# Altium footprint library PcbLib1.PcbLib: 1009 footprints (part 12 of 64)
Each footprint in its own frame and in the unit in brackets; x right, y up, seen from the top. Pads: shape width x height; smd on the part's side, far side on the other; paste and mask are expansions set on the pad; w line width, h text height; cw(c..) or ccw(c..) is an arc to the next point about the centre after c.
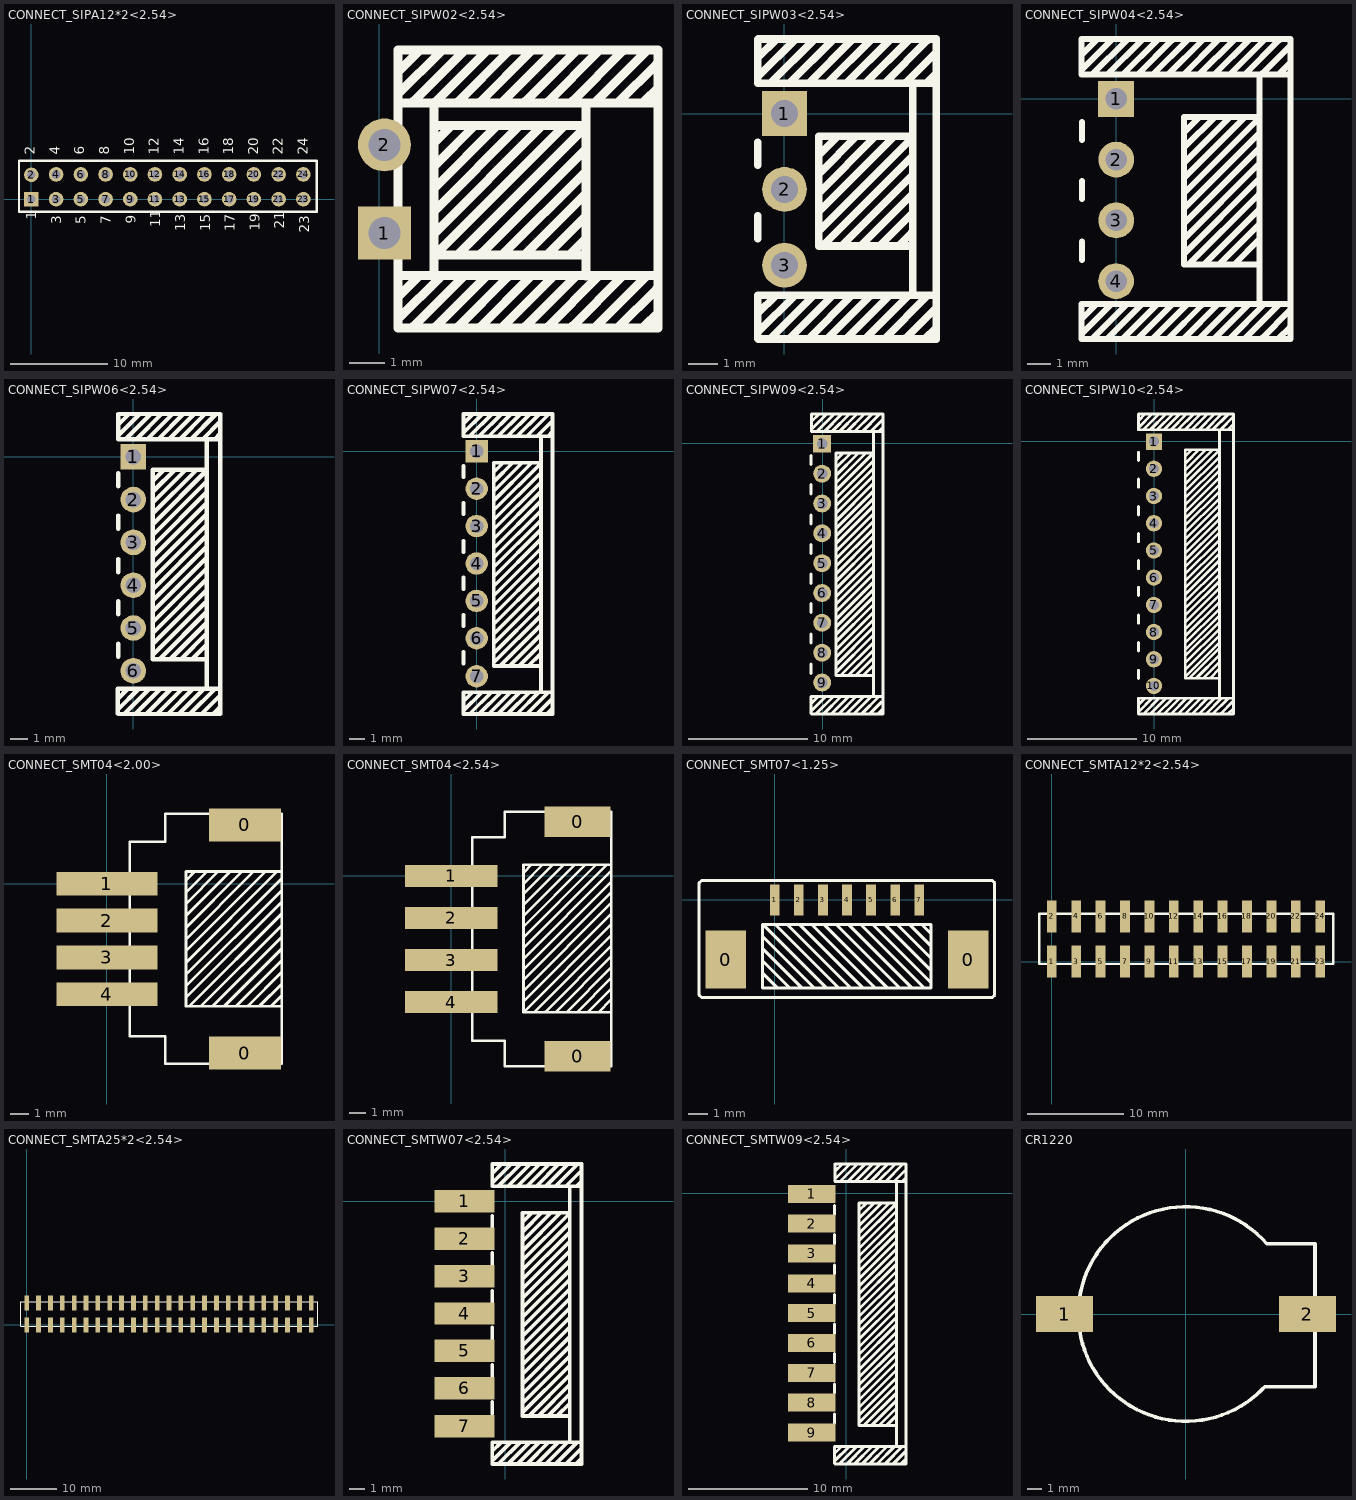
[diagram p11: the footprints below, top view; thin cyan lines are the x and y axes]

## CONNECT_SIPA12*2<2.54> [mm] "排针母座"
pads (24):
  rect 1.5x1.5 hole 0.9: 1(0,0)
  round 1.5 hole 0.9: 2(0,2.5) 3(2.54,0) 4(2.54,2.54) 5(5.08,0) 6(5.08,2.54) 7(7.62,0) 8(7.62,2.54) 9(10.16,0) 10(10.16,2.54) 11(12.7,0) 12(12.7,2.54) 13(15.24,0) 14(15.24,2.54) 15(17.78,0) 16(17.78,2.54) 17(20.32,0) 18(20.32,2.54) 19(22.86,0) 20(22.86,2.54) 21(25.4,0) 22(25.4,2.54) 23(27.94,0) 24(27.94,2.54)
Top Overlay:
  lines w0.254: -1.27,-1.295 29.337,-1.295 29.337,3.937 -1.27,3.937 -1.27,-1.295
  text "22" at 25.848,4.547 h1
  text "24" at 28.397,4.547 h1
  text "23" at 28.55,-3.454 h1
  text "21" at 26.001,-3.026 h1
  text "1" at 0.514,-2.136 h1
  text "19" at 23.452,-3.25 h1
  text "15" at 18.355,-3.297 h1
  text "11" at 13.257,-2.869 h1
  text "5" at 5.611,-2.564 h1
  text "3" at 3.062,-2.564 h1
  text "7" at 8.16,-2.564 h1
  text "9" at 10.709,-2.517 h1
  text "13" at 15.806,-3.297 h1
  text "17" at 20.903,-3.297 h1
  text "2" at 0.356,4.547 h1
  text "20" at 23.299,4.547 h1
  text "16" at 18.2,4.547 h1
  text "12" at 13.102,4.547 h1
  text "6" at 5.454,4.547 h1
  text "4" at 2.905,4.547 h1
  text "8" at 8.003,4.547 h1
  text "10" at 10.553,4.547 h1
  text "14" at 15.651,4.547 h1
  text "18" at 20.749,4.547 h1

## CONNECT_SIPW02<2.54> [mm] "四针白色插座（未加焊）"
height 7
pads (2):
  rect 1.5x1.5 hole 0.9: 1(0.152,-13.747)
  round 1.5 hole 0.9: 2(0.152,-11.247)
Top Overlay:
  lines w0.254: 0.533,-16.434 7.899,-16.434 7.899,-8.56 0.533,-8.56 ; 0.533,-16.408 0.533,-14.961 0.533,-10.033 0.533,-8.585 ; 0.533,-16.18 0.548,-16.18 1.76,-14.968 ; 0.533,-15.57 0.533,-15.559 1.125,-14.968 ; 0.533,-14.95 7.849,-14.95 ; 0.533,-10.058 7.899,-10.058 ; 0.533,-9.804 0.548,-9.804 1.76,-8.592 ; 0.533,-9.195 0.533,-9.184 1.125,-8.592 ; 0.965,-16.398 2.395,-14.968 ; 0.965,-10.022 2.395,-8.592 ; 1.549,-14.884 1.549,-14.315 1.549,-10.643 1.549,-10.124 ; 1.549,-12.497 3.353,-10.693 ; 1.549,-10.693 5.867,-10.693 ; 1.575,-11.836 2.718,-10.693 ; 1.575,-11.176 2.057,-10.693 ; 1.587,-13.094 3.988,-10.693 ; 1.589,-16.408 3.03,-14.968 ; 1.589,-10.033 3.03,-8.592 ; 1.593,-14.365 5.867,-14.365 ; 1.593,-14.358 5.258,-10.693 ; 1.6,-13.716 4.623,-10.693 ; 2.228,-16.408 3.667,-14.97 ; 2.228,-10.033 3.667,-8.594 ; 2.253,-14.333 5.867,-10.719 ; 2.859,-16.408 4.287,-14.981 ; 2.859,-10.033 4.287,-8.605 ; 2.908,-14.313 5.855,-11.367 ; 3.494,-16.408 4.935,-14.968 ; 3.494,-10.033 4.935,-8.592 ; 3.511,-14.345 5.855,-12.002 ; 4.133,-14.358 5.867,-12.624 ; 4.14,-16.398 5.583,-14.955 ; 4.14,-10.022 5.583,-8.58 ; 4.775,-16.408 6.21,-14.973 ; 4.775,-10.033 6.21,-8.598 ; 4.781,-14.345 5.842,-13.284 ; 5.39,-14.371 5.829,-13.932 ; 5.486,-16.383 6.909,-14.961 ; 5.486,-10.008 6.909,-8.585 ; 5.867,-14.961 5.867,-10.744 5.867,-10.109 ; 6.121,-16.415 7.56,-14.977 ; 6.121,-10.04 7.56,-8.601 ; 6.782,-16.415 7.865,-15.332 ; 6.782,-10.04 7.865,-8.957 ; 7.518,-16.39 7.903,-16.006 ; 7.518,-10.015 7.903,-9.63
3D body "v150-090.stp": height 0.02, standoff -1.65, extent -0.598,-11.997 0.902,-10.497
3D body "vf150-090.stp": height 0.01, standoff -1.65, extent -0.598,-14.497 0.902,-12.997
3D body "609-2p-vr130.stp": height 5.75, standoff -3.35, extent 0.02,-16.247 7.66,-8.747

## CONNECT_SIPW03<2.54> [mm] "四针白色插座（未加焊）"
height 7
pads (3):
  rect 1.5x1.5 hole 0.9: 1(0,0)
  round 1.5 hole 0.9: 2(0.003,-2.54) 3(0.003,-5.08)
Top Overlay:
  lines w0.254: -0.889,-7.315 -0.874,-7.315 0.337,-6.103 ; -0.889,-6.706 -0.889,-6.695 -0.298,-6.103 ; -0.889,-6.096 -0.889,-7.544 -0.882,-7.551 -0.063,-7.551 5.08,-7.551 5.08,2.5 -0.063,2.5 -0.878,2.5 -0.889,2.489 -0.889,1.016 5.029,1.016 ; -0.889,-6.085 5.08,-6.085 ; -0.889,-4.191 -0.889,-3.429 ; -0.889,-1.727 -0.889,-0.965 ; -0.889,1.245 -0.874,1.245 0.381,2.5 ; -0.889,1.854 -0.889,1.865 -0.254,2.5 ; -0.457,-7.544 -0.457,-7.533 0.972,-6.103 ; -0.457,1.016 -0.457,1.027 1.016,2.5 ; 0.102,-7.544 0.167,-7.544 1.607,-6.103 ; 0.102,1.016 0.167,1.016 1.651,2.5 ; 0.762,-7.544 0.806,-7.544 2.244,-6.105 ; 0.762,1.016 0.806,1.016 2.29,2.5 ; 1.143,-3.937 4.293,-0.787 ; 1.143,-2.667 3.048,-0.762 ; 1.143,-1.981 1.194,-1.981 2.413,-0.762 ; 1.143,-1.397 1.778,-0.762 ; 1.168,-3.277 3.683,-0.762 ; 1.333,-4.381 4.28,-1.435 ; 1.422,-7.544 1.437,-7.544 2.865,-6.116 ; 1.422,1.016 1.437,1.016 2.921,2.5 ; 1.936,-4.414 4.28,-2.07 ; 2.057,-7.544 2.072,-7.544 3.512,-6.103 ; 2.057,1.016 2.072,1.016 3.556,2.5 ; 2.558,-4.427 4.293,-2.692 ; 2.718,-7.544 2.718,-7.533 4.16,-6.091 ; 2.718,1.016 2.718,1.027 4.191,2.5 ; 3.206,-4.414 4.267,-3.353 ; 3.353,-7.544 4.788,-6.109 ; 3.353,1.016 4.788,2.451 ; 3.816,-4.439 4.255,-4 ; 4.064,-7.518 5.029,-6.553 ; 4.064,1.041 5.067,2.045 ; 4.293,-6.071 4.293,-0.787 ; 4.293,-4.434 1.143,-4.434 1.143,-0.762 4.293,-0.762 ; 4.293,0.889 4.293,-0.787 ; 4.699,-7.551 5.08,-7.17 ; 4.75,1.016 5.08,1.346

## CONNECT_SIPW04<2.54> [mm] "四针白色插座（未加焊）"
height 7
pads (4):
  rect 1.5x1.5 hole 0.9: 1(0,0)
  round 1.5 hole 0.9: 2(0.003,-2.54) 3(0.003,-5.08) 4(0,-7.62)
Top Overlay:
  lines w0.254: -1.422,-9.184 -0.831,-8.592 ; -1.422,-6.731 -1.422,-5.969 ; -1.422,-4.191 -1.422,-3.429 ; -1.422,-1.727 -1.422,-0.965 ; -1.422,1.865 -0.831,2.457 ; -1.408,-9.804 -0.196,-8.592 ; -1.408,1.245 -0.196,2.457 ; -0.991,-10.033 -0.991,-10.022 0.439,-8.592 ; -0.991,1.016 -0.991,1.027 0.439,2.457 ; -0.432,-10.033 -0.366,-10.033 1.074,-8.592 ; -0.432,1.016 -0.366,1.016 1.074,2.457 ; 0.229,-10.033 0.272,-10.033 1.711,-8.594 ; 0.229,1.016 0.272,1.016 1.711,2.455 ; 0.889,-10.033 0.904,-10.033 2.331,-8.605 ; 0.889,1.016 0.904,1.016 2.331,2.444 ; 1.524,-10.033 1.539,-10.033 2.979,-8.592 ; 1.524,1.016 1.539,1.016 2.979,2.457 ; 2.184,-10.033 2.184,-10.022 3.589,-8.618 ; 2.184,1.016 2.184,1.027 3.589,2.431 ; 2.819,-10.033 4.255,-8.598 ; 2.819,1.016 4.255,2.451 ; 2.845,-6.477 5.969,-3.353 ; 2.845,-5.842 5.994,-2.692 ; 2.845,-5.207 5.982,-2.07 ; 2.845,-4.572 5.982,-1.435 ; 2.845,-3.937 5.994,-0.787 ; 2.845,-2.667 4.75,-0.762 ; 2.845,-1.981 2.896,-1.981 4.115,-0.762 ; 2.845,-1.397 3.48,-0.762 ; 2.87,-3.277 5.385,-0.762 ; 2.997,-6.934 3.023,-6.934 5.956,-4 ; 3.48,-10.033 3.48,-10.022 4.909,-8.592 ; 3.48,1.016 3.48,1.027 4.909,2.457 ; 3.632,-6.934 3.658,-6.934 5.956,-4.635 ; 4.039,-10.033 4.104,-10.033 5.544,-8.592 ; 4.039,1.016 4.104,1.016 5.544,2.457 ; 4.242,-6.934 4.293,-6.934 5.982,-5.245 ; 4.699,-10.033 4.743,-10.033 6.181,-8.594 ; 4.699,1.016 4.743,1.016 6.181,2.455 ; 4.928,-6.934 5.969,-5.893 ; 5.359,-10.033 5.374,-10.033 6.802,-8.605 ; 5.359,1.016 5.374,1.016 6.802,2.444 ; 5.994,-8.585 5.994,-6.96 5.994,-0.787 ; 5.994,-6.934 2.845,-6.934 2.845,-0.762 5.994,-0.762 ; 5.994,0.889 5.994,-0.787 ; 6.121,-9.982 7.239,-8.865 ; 6.121,1.067 7.239,2.184 ; 6.807,-10.015 7.255,-9.567 ; 6.807,1.034 7.255,1.482 ; 7.264,-8.585 -1.448,-8.585 -1.448,-10.04 -0.063,-10.04 7.29,-10.04 7.29,2.5 -0.063,2.5 -1.448,2.5 -1.448,1.016 7.264,1.016
3D body "User Library-XHB-4AW.STEP": height 6.55, standoff -3.4, extent -1.455,-10.06 7.345,2.44

## CONNECT_SIPW06<2.54> [mm] "四针白色插座（未加焊）"
height 7
pads (6):
  rect 1.5x1.5 hole 0.9: 1(0,0.003)
  round 1.5 hole 0.9: 2(0,-2.497) 3(0,-4.997) 4(0,-7.497) 5(0,-9.997) 6(0,-12.497)
Top Overlay:
  lines w0.254: -0.914,-14.986 -0.914,-13.538 5.055,-13.538 ; -0.914,-14.148 -0.914,-14.137 -0.323,-13.545 ; -0.9,-14.757 0.312,-13.545 ; -0.889,-11.684 -0.889,-10.922 ; -0.889,-9.195 -0.889,-8.433 ; -0.889,-6.731 -0.889,-5.969 ; -0.889,-4.191 -0.889,-3.429 ; -0.889,-1.727 -0.889,-0.965 ; -0.889,1.245 -0.874,1.245 0.381,2.5 ; -0.889,1.854 -0.889,1.865 -0.254,2.5 ; -0.882,-15.018 5.08,-15.018 ; -0.483,-14.975 0.947,-13.545 ; -0.457,1.016 -0.457,1.027 1.016,2.5 ; 0.102,1.016 0.167,1.016 1.651,2.5 ; 0.142,-14.986 1.582,-13.545 ; 0.762,1.016 0.806,1.016 2.29,2.5 ; 0.78,-14.986 2.219,-13.547 ; 1.143,-11.557 4.267,-8.433 ; 1.143,-10.922 4.293,-7.772 ; 1.143,-10.287 4.28,-7.15 ; 1.143,-9.652 4.28,-6.515 ; 1.143,-9.017 4.267,-5.893 ; 1.143,-8.382 4.293,-5.232 ; 1.143,-7.747 4.28,-4.61 ; 1.143,-7.112 4.28,-3.975 ; 1.143,-6.477 4.267,-3.353 ; 1.143,-5.842 4.293,-2.692 ; 1.143,-5.207 4.28,-2.07 ; 1.143,-4.572 4.28,-1.435 ; 1.143,-3.937 4.293,-0.787 ; 1.143,-2.667 3.048,-0.762 ; 1.143,-1.397 1.778,-0.762 ; 1.168,-3.277 3.683,-0.762 ; 1.194,-1.981 2.413,-0.762 ; 1.397,-14.986 1.412,-14.986 2.839,-13.558 ; 1.422,1.016 1.437,1.016 2.921,2.5 ; 1.537,-11.798 4.255,-9.08 ; 2.032,-14.986 2.047,-14.986 3.487,-13.545 ; 2.057,1.016 2.072,1.016 3.556,2.5 ; 2.21,-11.76 4.255,-9.716 ; 2.692,-14.986 2.692,-14.975 4.135,-13.533 ; 2.718,1.016 2.718,1.027 4.191,2.5 ; 2.819,-11.786 4.28,-10.325 ; 3.327,-14.986 4.763,-13.551 ; 3.353,1.016 4.788,2.451 ; 3.467,-11.773 4.267,-10.973 ; 4.039,-14.961 5.004,-13.995 ; 4.064,1.041 5.067,2.045 ; 4.293,-13.513 4.293,-6.96 ; 4.293,-0.762 1.143,-0.762 1.143,-11.811 4.293,-11.811 4.293,-0.787 ; 4.293,0.889 4.293,-0.787 ; 4.674,-14.993 5.055,-14.612 ; 4.75,1.016 5.08,1.346 ; 5.029,1.016 -0.889,1.016 -0.889,2.489 -0.878,2.5 -0.063,2.5 5.08,2.5 5.08,-15.011

## CONNECT_SIPW07<2.54> [mm] "四针白色插座（未加焊）"
height 7
pads (7):
  rect 1.5x1.5 hole 0.9: 1(0,0.003)
  round 1.5 hole 0.9: 2(0,-2.497) 3(0,-4.997) 4(0,-7.497) 5(0,-9.997) 6(0,-12.497) 7(0,-15.037)
Top Overlay:
  lines w0.254: -0.889,-17.551 -0.889,-16.104 5.08,-16.104 ; -0.889,-17.323 -0.874,-17.323 0.337,-16.111 ; -0.889,-16.713 -0.889,-16.702 -0.298,-16.111 ; -0.889,-14.173 -0.889,-13.411 ; -0.889,-11.684 -0.889,-10.922 ; -0.889,-9.195 -0.889,-8.433 ; -0.889,-6.731 -0.889,-5.969 ; -0.889,-4.191 -0.889,-3.429 ; -0.889,-1.727 -0.889,-0.965 ; -0.889,1.245 -0.874,1.245 0.381,2.5 ; -0.889,1.854 -0.889,1.865 -0.254,2.5 ; -0.882,-17.558 5.08,-17.558 ; -0.457,-17.541 0.972,-16.111 ; -0.457,1.016 -0.457,1.027 1.016,2.5 ; 0.102,1.016 0.167,1.016 1.651,2.5 ; 0.167,-17.551 1.607,-16.111 ; 0.762,1.016 0.806,1.016 2.29,2.5 ; 0.806,-17.551 2.244,-16.113 ; 1.143,-14.351 4.293,-14.351 ; 1.143,-14.326 1.143,-0.762 4.293,-0.762 ; 1.143,-11.557 4.267,-8.433 ; 1.143,-10.922 4.293,-7.772 ; 1.143,-10.287 4.28,-7.15 ; 1.143,-9.652 4.28,-6.515 ; 1.143,-9.017 4.267,-5.893 ; 1.143,-8.382 4.293,-5.232 ; 1.143,-7.747 4.28,-4.61 ; 1.143,-7.112 4.28,-3.975 ; 1.143,-6.477 4.267,-3.353 ; 1.143,-5.842 4.293,-2.692 ; 1.143,-5.207 4.28,-2.07 ; 1.143,-4.572 4.28,-1.435 ; 1.143,-3.937 4.293,-0.787 ; 1.143,-2.667 3.048,-0.762 ; 1.143,-1.397 1.778,-0.762 ; 1.156,-13.475 4.28,-10.351 ; 1.168,-12.827 4.255,-9.741 ; 1.168,-12.192 4.255,-9.106 ; 1.168,-3.277 3.683,-0.762 ; 1.181,-14.084 4.267,-10.998 ; 1.194,-1.981 2.413,-0.762 ; 1.422,-17.551 1.437,-17.551 2.865,-16.124 ; 1.422,1.016 1.437,1.016 2.921,2.5 ; 1.562,-14.338 4.267,-11.633 ; 2.057,-17.551 2.072,-17.551 3.512,-16.111 ; 2.057,1.016 2.072,1.016 3.556,2.5 ; 2.197,-14.338 4.293,-12.243 ; 2.718,-17.551 2.718,-17.541 4.16,-16.098 ; 2.718,1.016 2.718,1.027 4.191,2.5 ; 2.832,-14.338 4.267,-12.903 ; 3.353,-17.551 4.788,-16.116 ; 3.353,1.016 4.788,2.451 ; 3.454,-14.351 4.293,-13.513 ; 4.064,-17.526 5.029,-16.561 ; 4.064,1.041 5.067,2.045 ; 4.293,-16.078 4.293,-6.96 ; 4.293,-11.811 4.293,-0.787 ; 4.293,0.889 4.293,-0.787 ; 4.699,-17.558 5.08,-17.177 ; 4.75,1.016 5.08,1.346 ; 5.029,1.016 -0.889,1.016 -0.889,2.489 -0.878,2.5 -0.063,2.5 5.08,2.5 5.08,-17.551

## CONNECT_SIPW09<2.54> [mm]
pads (9):
  rect 1.5x1.5 hole 0.9: 1(-0.051,-0.048)
  round 1.5 hole 0.9: 2(-0.051,-2.548) 3(-0.051,-5.048) 4(-0.051,-7.548) 5(-0.051,-10.048) 6(-0.051,-12.548) 7(-0.051,-15.049) 8(-0.051,-17.55) 9(-0.051,-20.051)
Top Overlay:
  lines w0.254: -0.965,-22.657 -0.965,-21.209 5.004,-21.209 ; -0.965,-21.819 -0.965,-21.808 -0.374,-21.216 ; -0.965,-19.279 -0.965,-18.517 ; -0.965,-16.739 -0.965,-15.977 ; -0.965,-14.199 -0.965,-13.437 ; -0.965,-11.735 -0.965,-10.973 ; -0.965,-9.246 -0.965,-8.484 ; -0.965,-6.782 -0.965,-6.02 ; -0.965,-4.242 -0.965,-3.48 ; -0.965,-1.778 -0.965,-1.016 ; -0.951,-22.428 0.261,-21.216 ; -0.94,1.194 -0.925,1.194 0.33,2.449 ; -0.94,1.803 -0.94,1.814 -0.305,2.449 ; -0.933,-22.689 5.029,-22.689 ; -0.533,-22.646 0.896,-21.216 ; -0.508,0.965 -0.508,0.976 0.965,2.449 ; 0.051,0.965 0.116,0.965 1.6,2.449 ; 0.091,-22.657 1.531,-21.216 ; 0.711,0.965 0.755,0.965 2.239,2.449 ; 0.73,-22.657 2.168,-21.218 ; 1.092,-19.482 4.242,-19.482 ; 1.092,-19.431 1.092,-0.813 4.242,-0.813 ; 1.092,-19.228 4.216,-16.104 ; 1.092,-18.593 4.242,-15.443 ; 1.092,-17.958 4.229,-14.821 ; 1.092,-17.323 4.229,-14.186 ; 1.092,-16.688 4.216,-13.564 ; 1.092,-16.053 4.242,-12.903 ; 1.092,-15.418 4.229,-12.281 ; 1.092,-14.783 4.229,-11.646 ; 1.092,-14.148 4.216,-11.024 ; 1.092,-13.513 4.242,-10.363 ; 1.092,-12.878 4.229,-9.741 ; 1.092,-12.243 4.229,-9.106 ; 1.092,-11.608 4.216,-8.484 ; 1.092,-10.973 4.242,-7.823 ; 1.092,-10.338 4.229,-7.201 ; 1.092,-9.703 4.229,-6.566 ; 1.092,-9.068 4.216,-5.944 ; 1.092,-8.433 4.242,-5.283 ; 1.092,-7.798 4.229,-4.661 ; 1.092,-7.163 4.229,-4.026 ; 1.092,-6.528 4.216,-3.404 ; 1.092,-5.893 4.242,-2.743 ; 1.092,-5.258 4.229,-2.121 ; 1.092,-4.623 4.229,-1.486 ; 1.092,-3.988 4.242,-0.838 ; 1.092,-2.718 2.997,-0.813 ; 1.092,-1.448 1.727,-0.813 ; 1.118,-3.327 3.632,-0.813 ; 1.143,-2.032 2.362,-0.813 ; 1.346,-22.657 1.361,-22.657 2.789,-21.229 ; 1.372,0.965 1.386,0.965 2.87,2.449 ; 1.486,-19.469 4.204,-16.751 ; 1.981,-22.657 1.996,-22.657 3.436,-21.216 ; 2.007,0.965 2.021,0.965 3.505,2.449 ; 2.159,-19.431 4.204,-17.386 ; 2.642,-22.657 2.642,-22.646 4.084,-21.204 ; 2.667,0.965 2.667,0.976 4.14,2.449 ; 2.769,-19.456 4.229,-17.996 ; 3.277,-22.657 4.712,-21.222 ; 3.302,0.965 4.737,2.4 ; 3.416,-19.444 4.216,-18.644 ; 3.988,-22.631 4.953,-21.666 ; 4.013,0.991 5.016,1.994 ; 4.242,-21.184 4.242,-7.01 ; 4.242,-11.862 4.242,-0.838 ; 4.242,0.838 4.242,-0.838 ; 4.623,-22.664 5.004,-22.283 ; 4.699,0.965 5.029,1.295 ; 4.978,0.965 -0.94,0.965 -0.94,2.438 -0.929,2.449 -0.114,2.449 5.029,2.449 5.029,-22.631

## CONNECT_SIPW10<2.54> [mm]
pads (10):
  rect 1.5x1.5 hole 0.9: 1(-0.051,-0.048)
  round 1.5 hole 0.9: 2(-0.051,-2.548) 3(-0.051,-5.048) 4(-0.051,-7.548) 5(-0.051,-10.048) 6(-0.051,-12.548) 7(-0.051,-15.049) 8(-0.051,-17.55) 9(-0.051,-20.051) 10(-0.051,-22.491)
Top Overlay:
  lines w0.254: -1.473,-21.819 -1.473,-21.057 ; -1.473,-19.279 -1.473,-18.517 ; -1.473,-16.739 -1.473,-15.977 ; -1.473,-14.199 -1.473,-13.437 ; -1.473,-11.735 -1.473,-10.973 ; -1.473,-9.246 -1.473,-8.484 ; -1.473,-6.782 -1.473,-6.02 ; -1.473,-4.242 -1.473,-3.48 ; -1.473,-1.778 -1.473,-1.016 ; -1.448,-24.221 -0.856,-23.629 ; -1.448,1.89 -0.856,2.482 ; -1.433,-24.841 -0.221,-23.629 ; -1.433,1.27 -0.221,2.482 ; -1.016,-25.07 -1.016,-25.059 0.414,-23.629 ; -1.016,1.041 -1.016,1.052 0.414,2.482 ; -0.457,-25.07 -0.392,-25.07 1.049,-23.629 ; -0.457,1.041 -0.392,1.041 1.049,2.482 ; 0.203,-25.07 0.247,-25.07 1.686,-23.631 ; 0.203,1.041 0.247,1.041 1.686,2.48 ; 0.864,-25.07 0.878,-25.07 2.306,-23.642 ; 0.864,1.041 0.878,1.041 2.306,2.469 ; 1.499,-25.07 1.513,-25.07 2.954,-23.629 ; 1.499,1.041 1.513,1.041 2.954,2.482 ; 2.159,-25.07 2.159,-25.059 3.563,-23.655 ; 2.159,1.041 2.159,1.052 3.563,2.457 ; 2.794,-25.07 4.229,-23.635 ; 2.794,1.041 4.229,2.476 ; 2.819,-21.666 5.944,-18.542 ; 2.819,-21.031 5.969,-17.882 ; 2.819,-20.396 5.956,-17.259 ; 2.819,-19.761 5.956,-16.624 ; 2.819,-19.202 5.944,-16.078 ; 2.819,-18.567 5.969,-15.418 ; 2.819,-17.932 5.956,-14.795 ; 2.819,-17.297 5.956,-14.16 ; 2.819,-16.662 5.944,-13.538 ; 2.819,-16.027 5.969,-12.878 ; 2.819,-15.392 5.956,-12.255 ; 2.819,-14.757 5.956,-11.62 ; 2.819,-14.122 5.944,-10.998 ; 2.819,-13.487 5.969,-10.338 ; 2.819,-12.852 5.956,-9.716 ; 2.819,-12.217 5.956,-9.08 ; 2.819,-11.582 5.944,-8.458 ; 2.819,-10.947 5.969,-7.798 ; 2.819,-10.312 5.956,-7.175 ; 2.819,-9.677 5.956,-6.54 ; 2.819,-9.042 5.944,-5.918 ; 2.819,-8.407 5.969,-5.258 ; 2.819,-7.772 5.956,-4.635 ; 2.819,-7.137 5.956,-4 ; 2.819,-6.502 5.944,-3.378 ; 2.819,-5.867 5.969,-2.718 ; 2.819,-5.232 5.956,-2.095 ; 2.819,-4.597 5.956,-1.46 ; 2.819,-3.962 5.969,-0.813 ; 2.819,-2.692 4.724,-0.787 ; 2.819,-1.422 3.454,-0.787 ; 2.845,-3.302 5.359,-0.787 ; 2.87,-2.007 4.089,-0.787 ; 3.213,-21.78 5.931,-19.063 ; 3.454,-25.07 3.454,-25.059 4.884,-23.629 ; 3.454,1.041 3.454,1.052 4.884,2.482 ; 3.886,-21.742 5.931,-19.698 ; 4.013,-25.07 4.079,-25.07 5.519,-23.629 ; 4.013,1.041 4.079,1.041 5.519,2.482 ; 4.496,-21.768 5.956,-20.307 ; 4.674,-25.07 4.717,-25.07 6.156,-23.631 ; 4.674,1.041 4.717,1.041 6.156,2.48 ; 5.143,-21.755 5.944,-20.955 ; 5.334,-25.07 5.349,-25.07 6.776,-23.642 ; 5.334,1.041 5.349,1.041 6.776,2.469 ; 5.969,-23.622 5.969,-6.985 ; 5.969,-21.793 2.819,-21.793 2.819,-0.787 5.969,-0.787 ; 5.969,-11.836 5.969,-0.813 ; 5.969,0.864 5.969,-0.813 ; 6.096,-25.019 7.214,-23.901 ; 6.096,1.092 7.214,2.21 ; 6.782,-25.051 7.23,-24.603 ; 6.782,1.06 7.23,1.508 ; 7.239,-23.622 -1.473,-23.622 -1.473,-25.077 -0.089,-25.077 7.264,-25.077 ; 7.239,2.489 -1.473,2.489 -1.473,1.034 -0.089,1.034 7.264,1.034 ; 7.264,-25.044 7.264,2.475

## CONNECT_SMT04<2.00> [mm]
pads (6):
  rect 3.9x1.8 smd mask+0.051: 0(7.5,-9.2) 0(7.5,3.2)
  rect 5.5x1.3 smd mask+0.051: 1(0,0) 2(0,-2) 3(0,-4) 4(0,-6)
Top Overlay:
  lines w0.152: 4.293,-5.563 9.5,-0.356 ; 4.293,-4.928 9.5,0.279 ; 4.293,-4.293 9.246,0.66 ; 4.293,-3.658 8.611,0.66 ; 4.293,-3.023 7.976,0.66 ; 4.293,-2.388 7.341,0.66 ; 4.293,-1.092 6.045,0.66 6.071,0.66 ; 4.293,-0.483 5.436,0.66 ; 4.293,0.178 4.775,0.66 4.801,0.66 ; 4.305,-6.185 9.5,-0.991 ; 4.305,-1.74 6.706,0.66 ; 4.483,-6.642 9.5,-1.626 ; 5.118,-6.642 9.5,-2.261 ; 5.766,-6.629 9.5,-2.896 ; 6.401,-6.629 9.5,-3.531 ; 7.01,-6.655 9.5,-4.166 ; 7.658,-6.642 9.5,-4.801 ; 8.306,-6.629 9.5,-5.436 ; 8.928,-6.642 9.5,-6.071 ; 1.245,-8.28 3.175,-8.28 3.175,-9.779 4.775,-9.779 9.5,-9.779 9.5,3.81 3.175,3.81 3.175,2.286 1.245,2.286 1.245,1.067 1.245,-8.28 ; 4.293,-6.655 9.5,-6.655 9.5,0.66 4.293,0.66 4.293,-6.655

## CONNECT_SMT04<2.54> [mm]
pads (6):
  rect 3.9x1.8 smd mask+0.051: 0(7.5,-10.7) 0(7.5,3.2)
  rect 5.5x1.3 smd mask+0.051: 1(0,0) 2(0,-2.5) 3(0,-5) 4(0,-7.5)
Top Overlay:
  lines w0.152: 4.293,-5.563 9.5,-0.356 ; 4.293,-4.928 9.5,0.279 ; 4.293,-4.293 9.246,0.66 ; 4.293,-3.658 8.611,0.66 ; 4.293,-3.023 7.976,0.66 ; 4.293,-2.388 7.341,0.66 ; 4.293,-1.092 6.045,0.66 6.071,0.66 ; 4.293,-0.483 5.436,0.66 ; 4.293,0.178 4.775,0.66 4.801,0.66 ; 4.305,-7.455 9.5,-2.261 ; 4.305,-6.185 9.5,-0.991 ; 4.305,-1.74 6.706,0.66 ; 4.318,-6.807 9.5,-1.626 ; 4.928,-8.103 9.5,-3.531 ; 5.588,-8.077 9.5,-4.166 ; 6.198,-8.103 9.5,-4.801 ; 6.833,-8.103 9.5,-5.436 ; 7.468,-8.103 9.5,-6.071 ; 8.103,-8.103 9.5,-6.706 ; 8.738,-8.103 9.5,-7.341 ; 9.5,-2.896 4.293,-8.103 ; 4.293,-8.103 4.293,0.66 9.5,0.66 9.5,-8.103 4.293,-8.103 ; 1.245,-9.779 3.175,-9.779 3.175,-11.303 3.251,-11.303 9.5,-11.303 9.5,3.81 3.175,3.81 3.175,2.286 1.245,2.286 1.245,1.067 1.245,-8.763 1.245,-9.779

## CONNECT_SMT07<1.25> [mm]
pads (9):
  rect 2.1x3 smd mask+0.051: 0(-2.55,-3.1) 0(10.05,-3.1)
  rect 0.5x1.6 smd mask+0.051: 1(0,0) 2(1.25,0) 3(2.5,0) 4(3.75,0) 5(5,0) 6(6.25,0) 7(7.5,0)
Top Overlay:
  lines w0.152: -0.635,-3.81 0.127,-4.572 ; -0.635,-3.175 0.762,-4.572 ; -0.635,-2.54 1.397,-4.572 ; -0.635,-1.905 2.032,-4.572 ; 0,-1.27 3.302,-4.572 ; 0.635,-1.27 3.937,-4.572 ; 1.27,-1.27 4.572,-4.572 ; 1.905,-1.27 5.207,-4.572 ; 2.54,-1.27 5.842,-4.572 ; 2.667,-4.572 -0.635,-1.27 ; 3.175,-1.27 6.477,-4.572 ; 3.81,-1.27 7.112,-4.572 ; 4.445,-1.27 7.747,-4.572 ; 5.08,-1.27 8.128,-4.318 ; 5.715,-1.27 8.128,-3.683 ; 6.35,-1.27 8.128,-3.048 ; 6.985,-1.27 8.128,-2.413 ; 7.62,-1.27 8.128,-1.778 ; -0.635,-1.27 8.128,-1.27 8.128,-4.572 -0.635,-4.572 -0.635,-1.27 ; -3.937,-4.953 -3.81,-5.08 11.303,-5.08 11.43,-4.953 11.43,0.889 11.303,1.016 -3.81,1.016 -3.937,0.889 -3.937,-4.953

## CONNECT_SMTA12*2<2.54> [mm] "牛角座"
pads (24):
  rect 1.02x3.3 smd: 1(0,0) 2(0,4.7) 3(2.54,0) 4(2.54,4.7) 5(5.08,0) 6(5.08,4.7) 7(7.62,0) 8(7.62,4.7) 9(10.16,0) 10(10.16,4.7) 11(12.7,0) 12(12.7,4.7) 13(15.24,0) 14(15.24,4.7) 15(17.78,0) 16(17.78,4.7) 17(20.32,0) 18(20.32,4.7) 19(22.86,0) 20(22.86,4.7) 21(25.4,0) 22(25.4,4.7) 23(27.94,0) 24(27.94,4.7)
Top Overlay:
  lines w0.254: -1.321,-0.254 -1.321,4.978 29.286,4.978 29.286,-0.254 -1.321,-0.254

## CONNECT_SMTA25*2<2.54> [mm] "牛角座"
pads (50):
  rect 1.02x3.3 smd: 1(0,0) 2(0,4.7) 3(2.54,0) 4(2.54,4.7) 5(5.08,0) 6(5.08,4.7) 7(7.62,0) 8(7.62,4.7) 9(10.16,0) 10(10.16,4.7) 11(12.7,0) 12(12.7,4.7) 13(15.24,0) 14(15.24,4.7) 15(17.78,0) 16(17.78,4.7) 17(20.32,0) 18(20.32,4.7) 19(22.86,0) 20(22.86,4.7) 21(25.4,0) 22(25.4,4.7) 23(27.94,0) 24(27.94,4.7) 25(30.48,0) 26(30.48,4.7) 27(33.02,0) 28(33.02,4.7) 29(35.56,0) 30(35.56,4.7) 31(38.1,0) 32(38.1,4.7) 33(40.64,0) 34(40.64,4.7) 35(43.18,0) 36(43.18,4.7) 37(45.72,0) 38(45.72,4.7) 39(48.26,0) 40(48.26,4.7) 41(50.8,0) 42(50.8,4.7) 43(53.34,0) 44(53.34,4.7) 45(55.88,0) 46(55.88,4.7) 47(58.42,0) 48(58.42,4.7) 49(60.96,0) 50(60.96,4.7)
Top Overlay:
  lines w0.254: -1.321,-0.254 -1.321,4.978 62.357,4.978 62.357,-0.254 -1.321,-0.254

## CONNECT_SMTW07<2.54> [mm] "四针白色插座（未加焊）"
height 7
pads (7):
  rect 4x1.5 smd: 1(-2.743,0) 2(-2.743,-2.497) 3(-2.743,-4.997) 4(-2.743,-7.497) 5(-2.743,-9.997) 6(-2.743,-12.497) 7(-2.743,-15.037)
Top Overlay:
  lines w0.254: -0.889,-17.551 -0.889,-16.104 5.08,-16.104 ; -0.889,-17.323 -0.874,-17.323 0.337,-16.111 ; -0.889,-16.713 -0.889,-16.702 -0.298,-16.111 ; -0.889,-14.173 -0.889,-13.411 ; -0.889,-11.684 -0.889,-10.922 ; -0.889,-9.195 -0.889,-8.433 ; -0.889,-6.731 -0.889,-5.969 ; -0.889,-4.191 -0.889,-3.429 ; -0.889,-1.727 -0.889,-0.965 ; -0.889,1.245 -0.874,1.245 0.381,2.5 ; -0.889,1.854 -0.889,1.865 -0.254,2.5 ; -0.882,-17.558 5.08,-17.558 ; -0.457,-17.541 0.972,-16.111 ; -0.457,1.016 -0.457,1.027 1.016,2.5 ; 0.102,1.016 0.167,1.016 1.651,2.5 ; 0.167,-17.551 1.607,-16.111 ; 0.762,1.016 0.806,1.016 2.29,2.5 ; 0.806,-17.551 2.244,-16.113 ; 1.143,-14.351 4.293,-14.351 ; 1.143,-14.326 1.143,-0.762 4.293,-0.762 ; 1.143,-11.557 4.267,-8.433 ; 1.143,-10.922 4.293,-7.772 ; 1.143,-10.287 4.28,-7.15 ; 1.143,-9.652 4.28,-6.515 ; 1.143,-9.017 4.267,-5.893 ; 1.143,-8.382 4.293,-5.232 ; 1.143,-7.747 4.28,-4.61 ; 1.143,-7.112 4.28,-3.975 ; 1.143,-6.477 4.267,-3.353 ; 1.143,-5.842 4.293,-2.692 ; 1.143,-5.207 4.28,-2.07 ; 1.143,-4.572 4.28,-1.435 ; 1.143,-3.937 4.293,-0.787 ; 1.143,-2.667 3.048,-0.762 ; 1.143,-1.397 1.778,-0.762 ; 1.156,-13.475 4.28,-10.351 ; 1.168,-12.827 4.255,-9.741 ; 1.168,-12.192 4.255,-9.106 ; 1.168,-3.277 3.683,-0.762 ; 1.181,-14.084 4.267,-10.998 ; 1.194,-1.981 2.413,-0.762 ; 1.422,-17.551 1.437,-17.551 2.865,-16.124 ; 1.422,1.016 1.437,1.016 2.921,2.5 ; 1.562,-14.338 4.267,-11.633 ; 2.057,-17.551 2.072,-17.551 3.512,-16.111 ; 2.057,1.016 2.072,1.016 3.556,2.5 ; 2.197,-14.338 4.293,-12.243 ; 2.718,-17.551 2.718,-17.541 4.16,-16.098 ; 2.718,1.016 2.718,1.027 4.191,2.5 ; 2.832,-14.338 4.267,-12.903 ; 3.353,-17.551 4.788,-16.116 ; 3.353,1.016 4.788,2.451 ; 3.454,-14.351 4.293,-13.513 ; 4.064,-17.526 5.029,-16.561 ; 4.064,1.041 5.067,2.045 ; 4.293,-16.078 4.293,-6.96 ; 4.293,-11.811 4.293,-0.787 ; 4.293,0.889 4.293,-0.787 ; 4.699,-17.558 5.08,-17.177 ; 4.75,1.016 5.08,1.346 ; 5.029,1.016 -0.889,1.016 -0.889,2.489 -0.878,2.5 -0.063,2.5 5.08,2.5 5.08,-17.551

## CONNECT_SMTW09<2.54> [mm]
pads (9):
  rect 4x1.5 smd: 1(-2.87,-0.051) 2(-2.87,-2.548) 3(-2.87,-5.048) 4(-2.87,-7.548) 5(-2.87,-10.048) 6(-2.87,-12.548) 7(-2.87,-15.049) 8(-2.87,-17.55) 9(-2.87,-20.051)
Top Overlay:
  lines w0.254: -0.965,-22.657 -0.965,-21.209 5.004,-21.209 ; -0.965,-21.819 -0.965,-21.808 -0.374,-21.216 ; -0.965,-19.279 -0.965,-18.517 ; -0.965,-16.739 -0.965,-15.977 ; -0.965,-14.199 -0.965,-13.437 ; -0.965,-11.735 -0.965,-10.973 ; -0.965,-9.246 -0.965,-8.484 ; -0.965,-6.782 -0.965,-6.02 ; -0.965,-4.242 -0.965,-3.48 ; -0.965,-1.778 -0.965,-1.016 ; -0.951,-22.428 0.261,-21.216 ; -0.94,1.194 -0.925,1.194 0.33,2.449 ; -0.94,1.803 -0.94,1.814 -0.305,2.449 ; -0.933,-22.689 5.029,-22.689 ; -0.533,-22.646 0.896,-21.216 ; -0.508,0.965 -0.508,0.976 0.965,2.449 ; 0.051,0.965 0.116,0.965 1.6,2.449 ; 0.091,-22.657 1.531,-21.216 ; 0.711,0.965 0.755,0.965 2.239,2.449 ; 0.73,-22.657 2.168,-21.218 ; 1.092,-19.482 4.242,-19.482 ; 1.092,-19.431 1.092,-0.813 4.242,-0.813 ; 1.092,-19.228 4.216,-16.104 ; 1.092,-18.593 4.242,-15.443 ; 1.092,-17.958 4.229,-14.821 ; 1.092,-17.323 4.229,-14.186 ; 1.092,-16.688 4.216,-13.564 ; 1.092,-16.053 4.242,-12.903 ; 1.092,-15.418 4.229,-12.281 ; 1.092,-14.783 4.229,-11.646 ; 1.092,-14.148 4.216,-11.024 ; 1.092,-13.513 4.242,-10.363 ; 1.092,-12.878 4.229,-9.741 ; 1.092,-12.243 4.229,-9.106 ; 1.092,-11.608 4.216,-8.484 ; 1.092,-10.973 4.242,-7.823 ; 1.092,-10.338 4.229,-7.201 ; 1.092,-9.703 4.229,-6.566 ; 1.092,-9.068 4.216,-5.944 ; 1.092,-8.433 4.242,-5.283 ; 1.092,-7.798 4.229,-4.661 ; 1.092,-7.163 4.229,-4.026 ; 1.092,-6.528 4.216,-3.404 ; 1.092,-5.893 4.242,-2.743 ; 1.092,-5.258 4.229,-2.121 ; 1.092,-4.623 4.229,-1.486 ; 1.092,-3.988 4.242,-0.838 ; 1.092,-2.718 2.997,-0.813 ; 1.092,-1.448 1.727,-0.813 ; 1.118,-3.327 3.632,-0.813 ; 1.143,-2.032 2.362,-0.813 ; 1.346,-22.657 1.361,-22.657 2.789,-21.229 ; 1.372,0.965 1.386,0.965 2.87,2.449 ; 1.486,-19.469 4.204,-16.751 ; 1.981,-22.657 1.996,-22.657 3.436,-21.216 ; 2.007,0.965 2.021,0.965 3.505,2.449 ; 2.159,-19.431 4.204,-17.386 ; 2.642,-22.657 2.642,-22.646 4.084,-21.204 ; 2.667,0.965 2.667,0.976 4.14,2.449 ; 2.769,-19.456 4.229,-17.996 ; 3.277,-22.657 4.712,-21.222 ; 3.302,0.965 4.737,2.4 ; 3.416,-19.444 4.216,-18.644 ; 3.988,-22.631 4.953,-21.666 ; 4.013,0.991 5.016,1.994 ; 4.242,-21.184 4.242,-7.01 ; 4.242,-11.862 4.242,-0.838 ; 4.242,0.838 4.242,-0.838 ; 4.623,-22.664 5.004,-22.283 ; 4.699,0.965 5.029,1.295 ; 4.978,0.965 -0.94,0.965 -0.94,2.438 -0.929,2.449 -0.114,2.449 5.029,2.449 5.029,-22.631

## CR1220 [mm]
pads (2):
  rect 4x2.5 smd: 1(-8.458,0) 2(8.509,0)
Top Overlay:
  lines w0.254: 5.303,-5.303 cw(c0,0) 5.671,4.908 ; 5.334,-5.283 5.537,-5.08 8.865,-5.08 9.042,-5.08 9.042,4.902 5.69,4.902
3D body "cr1220smd.STEP": height 4.94, standoff 0, extent -8.996,-7.62 9.504,7.377